# Altium footprint library Jetson-Nano-Baseboard.PcbLib: 60 footprints (part 3 of 4)
Each footprint in its own frame and in the unit in brackets; x right, y up, seen from the top. Pads: shape width x height; smd on the part's side, far side on the other; paste and mask are expansions set on the pad; w line width, h text height; cw(c..) or ccw(c..) is an arc to the next point about the centre after c.
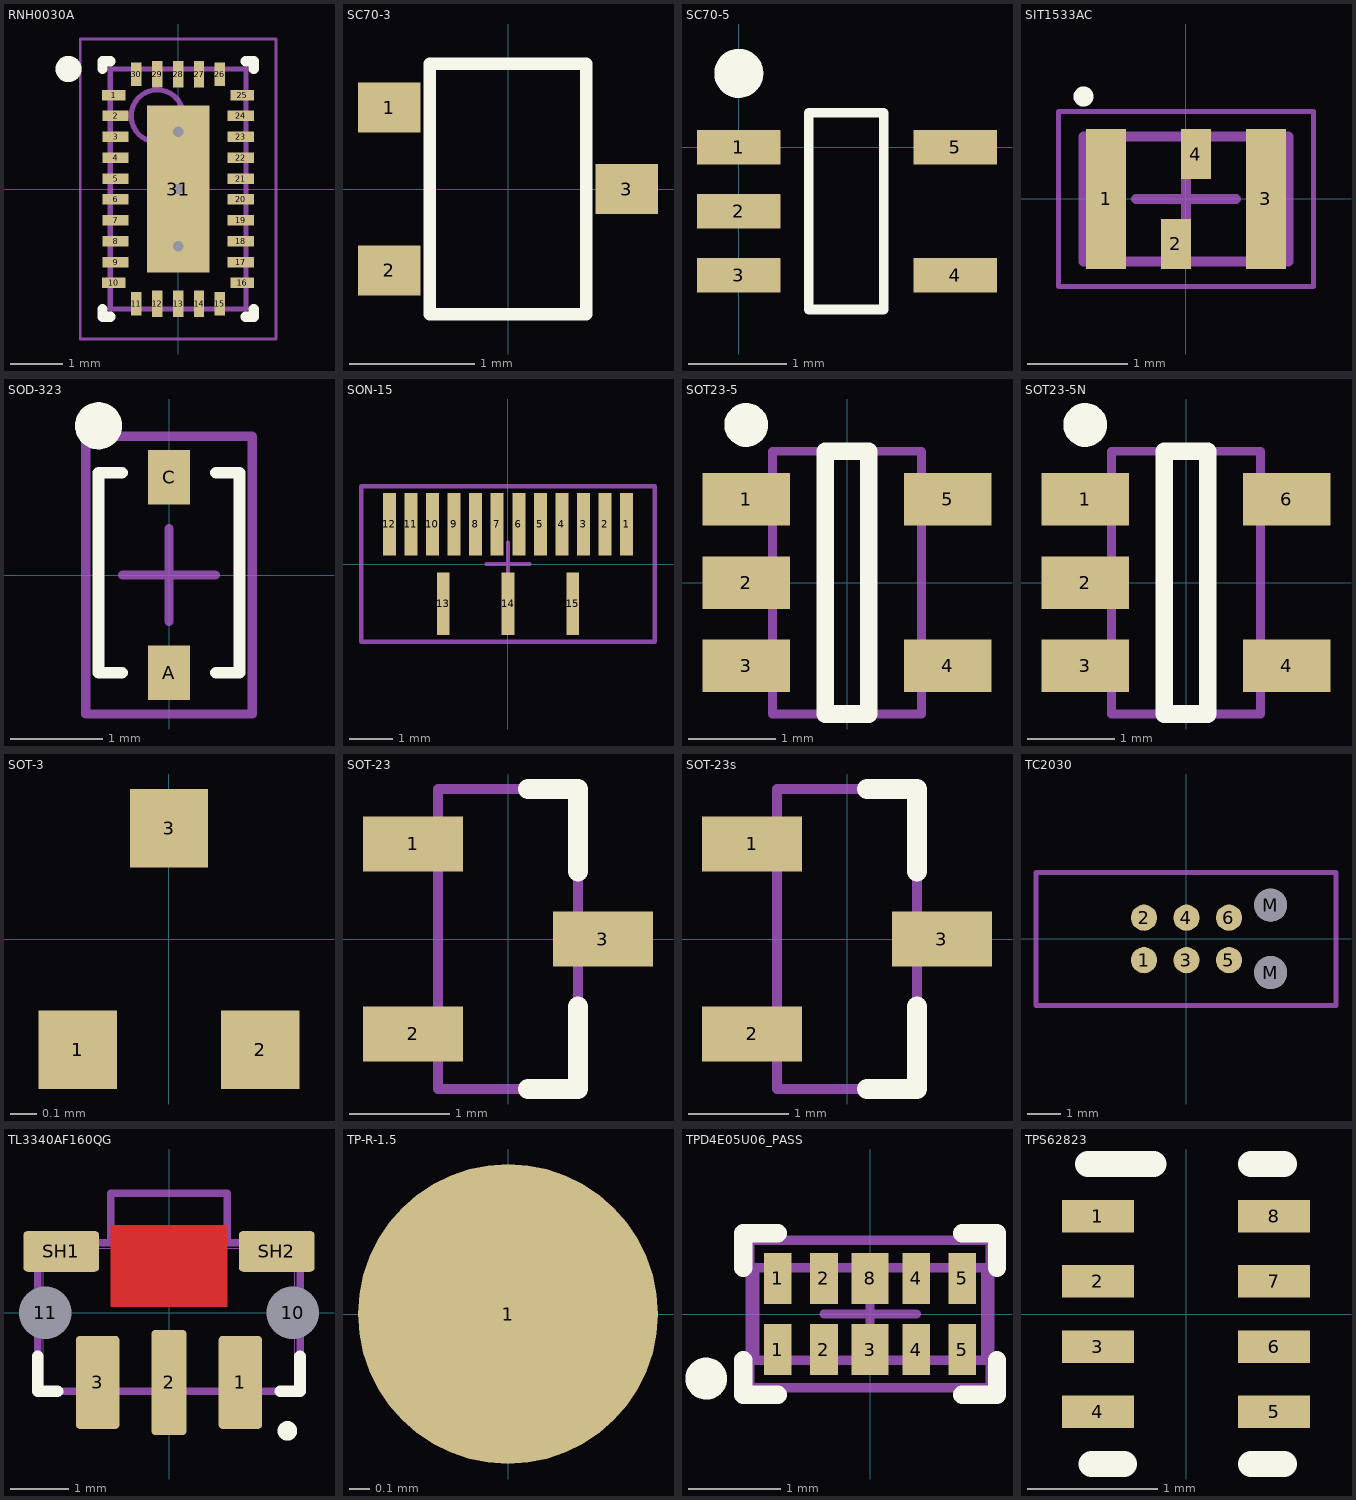
[diagram p2: the footprints below, top view; thin cyan lines are the x and y axes]

## RNH0030A [mm]
height 0.8
pads (31):
  rect 0.45x0.2 smd: 1(-1.23,1.8) 10(-1.23,-1.8) 16(1.225,-1.8) 25(1.225,1.8)
  rect 0.5x0.2 smd: 2(-1.2,1.4) 3(-1.2,1) 4(-1.2,0.6) 5(-1.2,0.2) 6(-1.2,-0.2) 7(-1.2,-0.6) 8(-1.2,-1) 9(-1.2,-1.4) 17(1.2,-1.4) 18(1.2,-1) 19(1.2,-0.6) 20(1.2,-0.2) 21(1.2,0.2) 22(1.2,0.6) 23(1.2,1) 24(1.2,1.4)
  rect 0.2x0.45 smd: 11(-0.8,-2.2) 15(0.8,-2.2) 26(0.8,2.2) 30(-0.8,2.2)
  rect 0.2x0.5 smd: 12(-0.4,-2.2) 13(0,-2.2) 14(0.4,-2.2) 27(0.4,2.2) 28(0,2.2) 29(-0.4,2.2)
  rect 1.2x3.2 smd: 31(0,0)
via 0,1.1 diameter 0.5 hole 0.2
via 0,0 diameter 0.5 hole 0.2
via 0,-1.1 diameter 0.5 hole 0.2
Top Overlay:
  circle w0.25: c-2.1,2.3 r0.125
  lines w0.2: -1.45,-2.3 -1.45,-2.45 -1.3,-2.45 ; -1.45,2.3 -1.45,2.45 -1.3,2.45 ; 1.3,-2.45 1.45,-2.45 1.45,-2.3 ; 1.3,2.45 1.45,2.45 1.45,2.3
Mechanical 13:
  circle w0.1: c-0.4,1.4 r0.5
  lines w0.1: -1.3,-2.3 -1.3,2.3 1.3,2.3 1.3,-2.3 -1.3,-2.3
Mechanical 15:
  lines w0.05: -1.875,-2.875 -1.875,2.875 1.875,2.875 1.875,-2.875 -1.875,-2.875
  lines w0.1: -0.5,0 0.5,0 ; 0,-0.5 0,0.5
3D body: height 0.8, standoff 0.05, extent -1.3,-2.3 1.3,2.3

## SC70-3 [mm] "SC70, 3-Leads, Pitch 0,65mm, EIAJ SC-88a"
height 1.1
pads (3):
  rect 0.5x0.4 smd: 1(-0.95,0.65) 2(-0.95,-0.65) 3(0.95,0)
Top Overlay:
  lines w0.1: -0.625,-1 -0.625,1 0.625,1 0.625,-1 -0.625,-1
3D body: height 1, standoff 0, extent -1.15,-1.075 1.15,1.025

## SC70-5 [mm] "SC70, 5-Leads, Pitch 0,65mm, EIAJ SC-88a"
height 1.1
pads (5):
  rect 0.85x0.35 smd: 1(0,0) 2(0,-0.65) 3(0,-1.3) 4(2.2,-1.3) 5(2.2,0)
Top Overlay:
  circle w0.25: c0,0.75 r0.125
  lines w0.1: 0.711,-1.65 1.473,-1.65 1.473,0.35 0.711,0.35 0.711,-1.65
3D body: height 0.96, standoff 0.01, extent 0.068,-1.635 2.168,0.365

## SIT1533AC [mm]
pads (4):
  rect 0.4x1.4 smd: 1(-0.8,0) 3(0.8,0)
  rect 0.3x0.5 smd: 2(-0.1,-0.45) 4(0.1,0.45)
Top Overlay:
  circle w0.1: c-1.025,1.025 r0.05
Mechanical 13:
  lines w0.1: -1.025,-0.625 -1.025,0.625 1.025,0.625 1.025,-0.625 -1.025,-0.625
Mechanical 15:
  lines w0.05: -1.275,-0.875 -1.275,0.875 1.275,0.875 1.275,-0.875 -1.275,-0.875
  lines w0.1: -0.5,0 0.5,0 ; 0,-0.5 0,0.5
3D body: height 0.55, standoff 0, extent -1,-0.6 1,0.6

## SOD-323 [mm]
pads (2):
  rect 0.45x0.59 smd: A(0,-1.055) C(0,1.055)
Top Overlay:
  circle w0.254: c-0.762,1.612 r0.127
  lines w0.127: -0.508,-1.055 -0.762,-1.055 -0.762,1.104 -0.508,1.104 ; 0.508,-1.055 0.762,-1.055 0.762,1.104 0.508,1.104
Mechanical 15:
  lines w0.1: -0.5,0 0.5,0 ; 0,-0.5 0,0.5 ; -0.9,-1.5 0.9,-1.5 0.9,1.5 0,1.5 -0.9,1.5 -0.9,-1.5
3D body: height 1, standoff 0.01, extent -0.625,-1.25 0.625,1.25

## SON-15 [mm]
height 0.8
pads (15):
  rect 0.3x1.45 smd: 1(2.75,0.925) 2(2.25,0.925) 3(1.75,0.925) 4(1.25,0.925) 5(0.75,0.925) 6(0.25,0.925) 7(-0.25,0.925) 8(-0.75,0.925) 9(-1.25,0.925) 10(-1.75,0.925) 11(-2.25,0.925) 12(-2.75,0.925) 13(-1.5,-0.925) 14(0,-0.925) 15(1.5,-0.925)
Mechanical 15:
  lines w0.1: -0.5,0 0.5,0 ; 0,-0.5 0,0.5 ; -3.4,-1.8 -3.4,1.8 -3.3,1.8 3.3,1.8 3.4,1.8 3.4,-1.8 3.3,-1.8 -3.4,-1.8
3D body: height 0.8, standoff -0.01, extent -3.3,-1.3 3.3,1.3

## SOT23-5 [mm] "SOT23, 5-Leads, Body 2,90x2,70mm, Pitch 0,95mm, IPC Medium Density"
height 1.45
pads (5):
  rect 1x0.6 smd: 1(-1.15,0.95) 2(-1.15,0) 3(-1.15,-0.95) 4(1.15,-0.95) 5(1.15,0.95)
Top Overlay:
  circle w0.25: c-1.15,1.8 r0.125
  lines w0.2: -0.25,-1.5 0.25,-1.5 0.25,1.5 -0.25,1.5 -0.25,-1.5
Mechanical 13:
  lines w0.1: -0.85,-1.5 -0.85,1.5 0.85,1.5 0.85,-1.5 -0.85,-1.5
3D body: height 1.1, standoff 0, extent -1.19,-1.462 1.21,1.438

## SOT23-5N [mm] "SOT23, 5-Leads, Body 2,90x2,70mm, Pitch 0,95mm, IPC Medium Density"
height 1.45
pads (5):
  rect 1x0.6 smd: 1(-1.15,0.95) 2(-1.15,0) 3(-1.15,-0.95) 4(1.15,-0.95) 6(1.15,0.95)
Top Overlay:
  circle w0.25: c-1.15,1.8 r0.125
  lines w0.2: -0.25,-1.5 0.25,-1.5 0.25,1.5 -0.25,1.5 -0.25,-1.5
Mechanical 13:
  lines w0.1: -0.85,-1.5 -0.85,1.5 0.85,1.5 0.85,-1.5 -0.85,-1.5
3D body: height 1.1, standoff 0, extent -1.19,-1.462 1.21,1.438

## SOT-3 [mm]
height 0.5
pads (3):
  rect 0.3x0.3 smd: 1(-0.35,-0.425) 2(0.35,-0.425) 3(0,0.425)
3D body: height 0.51, standoff 0, extent -0.508,-0.381 0.508,0.381

## SOT-23 [mm] "SOT23, 3-Leads, Body 2.90x2.45mm, Pitch 0.95mm, IPC Medium Density"
height 1.1
pads (3):
  rect 1x0.55 smd: 1(-0.95,0.95) 2(-0.95,-0.95) 3(0.95,0)
Top Overlay:
  lines w0.2: 0.2,-1.5 0.7,-1.5 0.7,-0.675 ; 0.2,1.5 0.7,1.5 0.7,0.675
Mechanical 13:
  lines w0.1: -0.7,-1.5 0.7,-1.5 0.7,1.5 -0.7,1.5 -0.7,-1.5
3D body: height 1.21, standoff -0.01, extent -1.126,-1.5 1.126,1.5

## SOT-23s [mm] "SOT23, 3-Leads, Body 2.90x2.45mm, Pitch 0.95mm, IPC Medium Density"
height 1.1
pads (3):
  rect 1x0.55 smd: 1(-0.95,0.95) 2(-0.95,-0.95) 3(0.95,0)
Top Overlay:
  lines w0.2: 0.2,-1.5 0.7,-1.5 0.7,-0.675 ; 0.2,1.5 0.7,1.5 0.7,0.675
Mechanical 13:
  lines w0.1: -0.7,-1.5 -0.7,1.5 0.7,1.5 0.7,-1.5 -0.7,-1.5
3D body: height 1.21, standoff -0.01, extent -1.126,-1.5 1.126,1.5

## TC2030 [mm]
pads (8):
  round 0.787 smd paste-2: 1(-1.265,-0.637) 2(-1.265,0.638) 3(0.01,-0.637) 4(0.01,0.638) 5(1.285,-0.637) 6(1.285,0.638)
  round 0.991 hole 0.991 unplated: M(2.54,-1.013) M(2.54,1.014)
Mechanical 3:
  lines w0.15: -4.51,-2.004 -4.51,2 4.5,2 4.5,-2.004 -4.51,-2.004

## TL3340AF160QG [mm] "SWITCH TACT SUB MINI 160GF SMD"
height 3.3
pads (7):
  rrect20% 0.75x1.6 smd: 1(1.225,-1.2) 3(-1.225,-1.2)
  rrect20% 0.6x1.8 smd: 2(0,-1.2)
  round 0.5 hole 0.9: 10(2.125,0) 11(-2.125,0)
  rrect20% 1.3x0.7 smd: SH1(-1.85,1.05) SH2(1.85,1.05)
Top Layer:
  pour cut-out: -1,0.103 -1,1.5 1,1.5 1,0.103
Top Overlay:
  circle w0.254: c2.032,-2.032 r0.041
  lines w0.2: -2.255,-0.75 -2.255,-1.35 -1.915,-1.35 ; 1.91,-1.35 2.25,-1.35 2.25,-0.75
Mechanical 2:
  lines w0.001: -2.25,1.105 2.25,1.105 ; -2.155,-1.35 -2.155,1.2 ; -1,1.2 -1,2.05 1,2.05 1,1.2 ; 2,1.2 2.25,1.2 ; 2.155,-1.35 2.155,1.2 2.25,1.2 ; 2.155,-0.42 2.25,-0.42 ; 2.155,0.42 2.25,0.42 ; -2.25,1.2 -2,1.2 -2.25,1.2 ; -2.25,1.2 2.25,1.2 ; -2.25,1.2 -2.25,-1.35 2.25,-1.35 2.25,1.2
Mechanical 3:
  lines w0.127: -1,1.2 -1,2.05 1,2.05 1,1.2 ; -2.25,-1.35 2.25,-1.35 2.25,1.2 -2.25,1.2 -2.25,-1.35
3D body: height 0, standoff -0.45, extent -2.25,-0.42 -2.155,0.42
3D body: height 0, standoff -0.45, extent 2.155,-0.42 2.25,0.42
3D body: height 3.3, standoff 0, extent 2.155,-1.35 2.25,1.105
3D body: height 3.3, standoff 0, extent -2.25,-1.35 -2.155,1.105
3D body: height 3.3, standoff 0, extent -2.25,1.105 2.25,1.2
3D body: height 3.3, standoff 0, extent -2.155,-1.35 2.155,1.105
3D body: height 2.7, standoff 0.7, extent -0.996,1.201 0.996,2.051
3D body: height 3, standoff 2.4, extent -2,1.2 -1.402,1.4
3D body: height 3, standoff 2.4, extent 1.402,1.2 2,1.4

## TP-R-1.5 [mm]
pads (1):
  round 1.5 smd paste-0.75: 1(0,0)

## TPD4E05U06_PASS [mm]
height 13.55
pads (10):
  rect 0.3x0.55 smd: 1(-1,-0.385) 1(-1,0.385) 2(-0.5,-0.385) 2(-0.5,0.385) 4(0.5,-0.385) 4(0.5,0.385) 5(1,-0.385) 5(1,0.385)
  rect 0.4x0.55 smd: 3(0,-0.385) 8(0,0.385)
Top Overlay:
  circle w0.254: c-1.775,-0.7 r0.1
  lines w0.2: -1.375,-0.5 -1.375,-0.875 -1,-0.875 ; -1.375,0.5 -1.375,0.875 -1,0.875 ; 1,-0.875 1.375,-0.875 1.375,-0.5 ; 1,0.875 1.375,0.875 1.375,0.5
Mechanical 13:
  lines w0.1: -1.25,-0.5 1.25,-0.5 1.25,0.5 -1.25,0.5 -1.25,-0.5
Mechanical 15:
  lines w0.1: -0.5,0 0.5,0 ; 0,-0.5 0,0.5 ; -1.3,-0.8 -1.3,0.8 1.3,0.8 1.3,-0.8 -1.3,-0.8
3D body: height 0.56, standoff 0.01, extent -1.25,-0.5 1.25,0.51

## TPS62823 [mm]
pads (8):
  rect 0.55x0.25 smd: 1(-0.675,0.75) 2(-0.675,0.25) 3(-0.675,-0.25) 4(-0.675,-0.75) 5(0.675,-0.75) 6(0.675,-0.25) 7(0.675,0.25) 8(0.675,0.75)
Top Overlay:
  lines w0.2: -0.75,1.15 -0.25,1.15 ; -0.725,-1.15 -0.475,-1.15 ; 0.5,-1.15 0.75,-1.15 ; 0.5,1.15 0.75,1.15
3D body: height 1.1, standoff 0, extent -0.762,-1.016 0.762,1.016